# Altium footprint library 1MaxPcb.PcbLib: 187 footprints (part 5 of 12)
Each footprint in its own frame and in the unit in brackets; x right, y up, seen from the top. Pads: shape width x height; smd on the part's side, far side on the other; paste and mask are expansions set on the pad; w line width, h text height; cw(c..) or ccw(c..) is an arc to the next point about the centre after c.
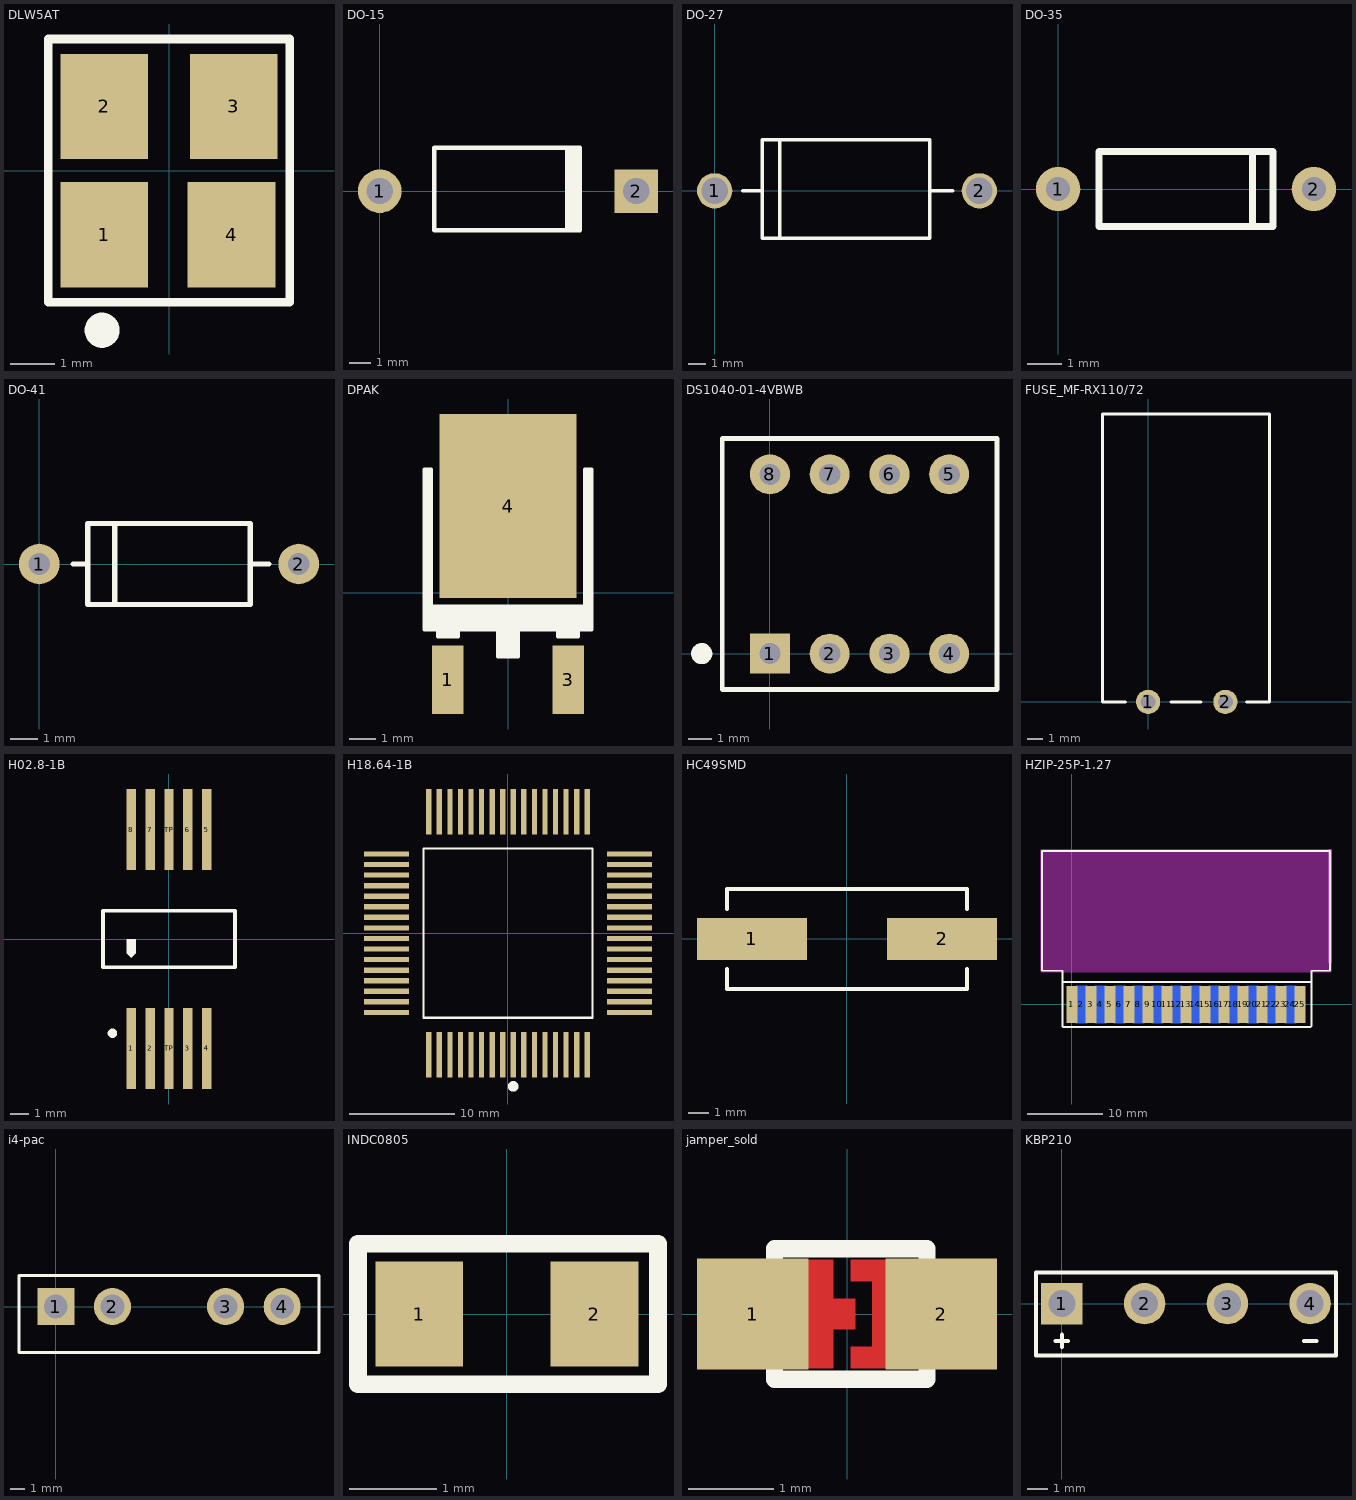
[diagram p4: the footprints below, top view; thin cyan lines are the x and y axes]

## DLW5AT [mm]
height 2.2
pads (4):
  rect 2x2.4 smd paste-25.4: 1(-1.475,-1.462) 2(-1.475,1.463) 3(1.475,1.463) 4(1.425,-1.462)
Top Overlay:
  circle w0.4: c-1.525,-3.637 r0.2
  lines w0.2: -2.75,-3 2.75,-3 2.75,3 -2.75,3 -2.75,-3
3D body "DLW5BT.STEP": height 2.45, standoff 0, extent -2.475,-2.513 2.525,2.487

## DO-15 [mm]
height 3.5
pads (2):
  round 2 hole 1.2: 1(0,0)
  rect 2x2 hole 1.2: 2(11.78,0)
Top Overlay:
  rectangle: 8.5,-1.8 9.3,2
  lines w0.2: 9.2,-1.8 2.5,-1.8 2.5,2 8.6,2 9.2,2
3D body "DO-15.step": height 4.78, standoff -1, extent -1.505,-1.825 12.955,1.74

## DO-27 [mm]
pads (2):
  round 2 hole 1.5: 1(0,0) 2(15,0)
Top Overlay:
  lines w0.2: 1.6,0 2.7,0 ; 3.7,-2.7 3.7,2.9 ; 12.2,0 13.5,0 ; 2.7,-2.7 12.2,-2.7 12.2,2.9 2.7,2.9 2.7,-2.7

## DO-35 [mm]
pads (2):
  round 1.3 hole 0.7: 1(0,0) 2(7.5,0)
Top Overlay:
  lines w0.2: 5.7,-1.1 5.7,1.1 ; 1.2,-1.1 6.3,-1.1 6.3,1.1 1.2,1.1 1.2,-1.1

## DO-41 [mm]
pads (2):
  round 1.5 hole 0.8: 1(0,0) 2(9.6,0)
Top Overlay:
  lines w0.2: 1.25,0 1.8,0 ; 2.8,-1.5 2.8,1.5 ; 8.5,0 7.8,0 ; 1.8,0 1.8,-1.5 7.8,-1.5 7.8,0 ; 1.8,0 1.8,1.5 7.8,1.5 7.8,0
3D body "DO41-P7p7-.SLDPRT": height 3.56, standoff -2.58, extent 0.332,-1.359 9.118,1.348

## DPAK [mm]
height 2.5
pads (3):
  rect 1.2x2.6 smd: 1(-2.286,-3.302) 3(2.286,-3.302)
  rect 5.2x7 smd paste-25.4: 4(0,3.302)
Top Overlay:
  region: -0.381,-1.397 -0.381,-2.413 0.381,-2.413 0.381,-1.397
  region: -3.175,-0.508 -3.175,-1.397 3.175,-1.397 3.175,-0.508
  region: 2.921,-0.508 3.175,-0.508 3.175,4.699 2.921,4.699
  region: -3.175,-0.508 -2.921,-0.508 -2.921,4.699 -3.175,4.699
  region: 1.905,-1.397 1.905,-1.651 2.667,-1.651 2.667,-1.397
  region: -2.667,-1.397 -2.667,-1.651 -1.905,-1.651 -1.905,-1.397
  lines w0.15: -3.175,-0.508 3.175,-0.508 ; -2.921,-0.508 -2.921,4.699 -3.175,4.699 -3.175,-1.397 3.175,-1.397 3.175,4.699 2.921,4.699 2.921,-0.508 ; -2.667,-1.397 -2.667,-1.651 -1.905,-1.651 -1.905,-1.397 ; -0.381,-1.397 -0.381,-2.413 0.381,-2.413 0.381,-1.397 ; 1.905,-1.397 1.905,-1.651 2.667,-1.651 2.667,-1.397
Top Paste:
  region: 2.413,3.175 0.127,3.175 0.127,0 2.413,0
  region: -0.127,3.175 -2.413,3.175 -2.413,0 -0.127,0
  region: 2.413,6.604 0.127,6.604 0.127,3.429 2.413,3.429
  region: -0.127,6.604 -2.413,6.604 -2.413,3.429 -0.127,3.429
3D body "DPAK.STEP": height 2.43, standoff 0, extent -3.3,-3.87 3.2,6.27

## DS1040-01-4VBWB [mm] "DIP переключатель"
pads (8):
  rect 1.7x1.7 hole 0.9: 1(0,0)
  round 1.7 hole 0.9: 2(2.54,0) 3(5.08,0) 4(7.62,0) 5(7.62,7.62) 6(5.08,7.62) 7(2.54,7.62) 8(0,7.62)
Top Overlay:
  circle w0.5: c-2.9,0 r0.2
  lines w0.2: -2.032,-1.524 9.652,-1.524 9.652,9.144 -2.032,9.144 -2.032,-1.524
3D body "User Library-DIP-Switch04.STEP": height 7, standoff -3.7, extent -1.77,-1.14 9.39,8.76

## FUSE_MF-RX110/72 [mm]
pads (2):
  round 1.6 hole 1: 1(0,0) 2(5.1,0)
Top Overlay:
  lines w0.2: -1.5,0 -3,0 -3,19 8,19 8,0 6.5,0 ; 1.5,0 3.5,0
3D body "pts.stp": height 3.04, standoff -4.25, extent -2.74,-0.45 7.74,18.874

## H02.8-1В [mm]
pads (10):
  rect 0.5x4.3 smd: 1(-2,-5.8) 2(-1,-5.8) 3(1,-5.8) 4(2,-5.8) 5(2,5.8) 6(1,5.8) 7(-1,5.8) 8(-2,5.8) TP(0,-5.8) TP(0,5.8)
Top Overlay:
  circle w0.25: c-3,-4.995 r0.125
  region: -2.25,-0.75 -2,-1 -1.75,-0.75 -1.75,0 -2.25,0
  lines w0.2: -3.5,-1.5 -3.5,1.5 3.5,1.5 3.5,-1.5 -3.5,-1.5
3D body "Н02.8-1В.STEP": height 2.9, standoff 0, extent -3.25,-7.5 3.25,7.5

## H18.64-1В [mm]
height 0.6
pads (64):
  rect 0.5x4.3 smd: 1(0.5,-11.5) 2(1.5,-11.5) 3(2.5,-11.5) 4(3.5,-11.5) 5(4.5,-11.5) 6(5.5,-11.5) 7(6.5,-11.5) 8(7.5,-11.5) 25(7.5,11.5) 26(6.5,11.5) 27(5.5,11.5) 28(4.5,11.5) 29(3.5,11.5) 30(2.5,11.5) 31(1.5,11.5) 32(0.5,11.5) 33(-0.5,11.5) 34(-1.5,11.5) 35(-2.5,11.5) 36(-3.5,11.5) 37(-4.5,11.5) 38(-5.5,11.5) 39(-6.5,11.5) 40(-7.5,11.5) 57(-7.5,-11.5) 58(-6.5,-11.5) 59(-5.5,-11.5) 60(-4.5,-11.5) 61(-3.5,-11.5) 62(-2.5,-11.5) 63(-1.5,-11.5) 64(-0.5,-11.5)
  rect 4.3x0.5 smd: 9(11.5,-7.5) 10(11.5,-6.5) 11(11.5,-5.5) 12(11.5,-4.5) 13(11.5,-3.5) 14(11.5,-2.5) 15(11.5,-1.5) 16(11.5,-0.5) 17(11.5,0.5) 18(11.5,1.5) 19(11.5,2.5) 20(11.5,3.5) 21(11.5,4.5) 22(11.5,5.5) 23(11.5,6.5) 24(11.5,7.5) 41(-11.5,7.5) 42(-11.5,6.5) 43(-11.5,5.5) 44(-11.5,4.5) 45(-11.5,3.5) 46(-11.5,2.5) 47(-11.5,1.5) 48(-11.5,0.5) 49(-11.5,-0.5) 50(-11.5,-1.5) 51(-11.5,-2.5) 52(-11.5,-3.5) 53(-11.5,-4.5) 54(-11.5,-5.5) 55(-11.5,-6.5) 56(-11.5,-7.5)
Top Overlay:
  circle w0.5: c0.5,-14.5 r0.25
  lines w0.2: -8,-8 8,-8 8,8 -8,8 -8,-8
3D body "Миландр. STEP-модель для корпуса Н18.64-1В.STEP": height 2.83, standoff -0.02, extent -12.75,-12.75 12.75,12.75

## HC49SMD [mm]
pads (2):
  rect 5.5x2.1 smd: 1(-4.75,0) 2(4.75,0)
Top Overlay:
  lines w0.2: -6,-1.5 -6,-2.5 6,-2.5 6,-1.5 ; -6,1.5 -6,2.5 6,2.5 6,1.5
3D body "User Library-Crystal HC49_US-SM.step": height 4.3, standoff 0, extent -6.4,-2.415 6.4,2.415

## HZIP-25P-1.27 [mm]
pads (25):
  rect 1.5x5 smd: 1(0,0) 3(2.54,0) 5(5.08,0) 7(7.62,0) 9(10.16,0) 11(12.7,0) 13(15.24,0) 15(17.78,0) 17(20.32,0) 19(22.86,0) 21(25.4,0) 23(27.94,0) 25(30.48,0)
  rect 1.5x5 smd far side: 2(1.27,0) 4(3.81,0) 6(6.35,0) 8(8.89,0) 10(11.43,0) 12(13.97,0) 14(16.51,0) 16(19.05,0) 18(21.59,0) 20(24.13,0) 22(26.67,0) 24(29.21,0)
Top Overlay:
  lines w0.254: -1.25,3 32,3 ; -1.25,3 -1.25,4.2 -1.25,4.45 -1.3,4.5 -4,4.5 -4,20.5 34.5,20.5 34.5,4.5 ; -1.25,3 -1.25,-2.95 -1.2,-3 31.9,-3 32,-2.9 32,3 ; 32,3 32,4.2 32,4.5 34.5,4.5 ; 34.5,4.5 34.5,4.5
Bottom Overlay:
  lines w0.254: -1.2,4.5 -1.2,-3 32,-3 32,4.5 ; -4.8,4.5 -4.8,20.5 35.3,20.5 35.3,4.5 ; -4.8,4.5 -4.8,4.5 ; -4.8,4.5 35.3,4.5 ; 35.3,4.5 35.3,4.5
Keep-Out Layer:
  board cut-out: -4,4.5 -4,20.5 34.5,20.5 34.5,4.5
Keep-Out Layer:
  lines w0.5: -4,4.5 -4,20.5 34,20.5 34.5,20.5 34.5,19.031 34.5,18.094 34.5,16.125 34.5,9.375 34.5,7.406 34.5,6.469 34.5,4.5 -4,4.5
Mechanical 15 keep-out:
  lines w0.5: 34.5,5.625 34.5,14.875 34.5,17.156 34.5,18.719 34.5,20.5
3D body "HZIP25-P1.27mm.stp": height 0.42, standoff -4.58, extent -2.8,-0.499 33.2,20.2

## i4-pac [mm]
pads (4):
  rect 2.5x2.5 hole 1.6: 1(0,0)
  round 2.5 hole 1.6: 2(3.81,0) 3(11.43,0) 4(15.24,0)
Top Overlay:
  lines w0.2: -2.48,-3.1 17.72,-3.1 17.72,2.1 -2.48,2.1 -2.48,-3.1
3D body "i4-Pac.stp": height 24.87, standoff -2.39, extent -2.525,-3.1 17.765,1.905

## INDC0805 [mm]
height 0.5
pads (2):
  rect 1x1.2 smd mask+0.03: 1(-1,0) 2(1,0)
Top Overlay:
  lines w0.2: -1.7,-0.8 1.725,-0.8 1.725,0.8 -1.7,0.8 -1.7,-0.8
3D body "User Library-ind_0805.step": height 0.95, standoff 0, extent -1,-0.6 1,0.6

## jamper_sold [mm]
pads (2):
  rect 1.3x1.3 smd: 1(-1.1,0) 2(1.1,0)
Top Layer:
  region: -0.49,0.635 -0.16,0.635 -0.16,0.178 0.094,0.178 0.094,-0.178 -0.16,-0.178 -0.16,-0.635 -0.49,-0.635
  region: 0.043,0.635 0.043,0.381 0.297,0.381 0.297,-0.381 0.043,-0.381 0.043,-0.635 0.551,-0.635 0.551,0.635
Top Overlay:
  lines w0.2: -0.846,-0.762 -0.846,0.762 0.932,0.762 0.932,-0.762 -0.846,-0.762
Top Solder:
  region: -0.49,0.635 -0.16,0.635 -0.16,0.178 0.094,0.178 0.094,-0.178 -0.16,-0.178 -0.16,-0.635 -0.49,-0.635
  region: 0.043,0.635 0.043,0.381 0.297,0.381 0.297,-0.381 0.043,-0.381 0.043,-0.635 0.551,-0.635 0.551,0.635

## KBP210 [mm]
pads (4):
  rect 2x2 hole 1.3: 1(0,0)
  round 2 hole 1.3: 2(4,0) 3(8,0) 4(12,0)
Top Overlay:
  lines w0.2: -0.3,-1.8 0.3,-1.8 ; 0,-2.1 0,-1.5 ; 11.7,-1.8 12.3,-1.8 ; -1.25,-2.5 -1.25,1.5 13.25,1.5 13.25,-2.5 -1.25,-2.5